# Altium footprint library Package_BGA.PcbLib: 159 footprints (part 6 of 22) (continued)
## Linear_BGA-133_15.0x15.0mm_Layout12x12_P1.27mm [mm] (continued)
F.SilkS:
  lines w0.12: -7.61,6.61 -7.61,-7.61 7.61,-7.61 7.61,7.61 -6.61,7.61
F.CrtYd:
  lines w0.05: -8.5,-8.5 8.5,-8.5 8.5,8.5 -8.5,8.5 -8.5,-8.5
F.Fab:
  lines w0.1: -7.5,-7.5 -7.5,6.5 -6.5,7.5 7.5,7.5 7.5,-7.5 -7.5,-7.5
  text "'.Designator'" at -4.047,-0.84 h1

## MAPBGA_9x9mm_Layout17x17_P0.5mm [mm]
pads (272):
  round 0.25 smd: A2(-3.5,4) A3(-3,4) A4(-2.5,4) A5(-2,4) A6(-1.5,4) A7(-1,4) A8(-0.5,4) A9(0,4) A10(0.5,4) A11(1,4) A12(1.5,4) A13(2,4) A14(2.5,4) A15(3,4) A16(3.5,4) A17(4,4) B1(-4,3.5) B2(-3.5,3.5) B3(-3,3.5) B4(-2.5,3.5) B5(-2,3.5) B6(-1.5,3.5) B7(-1,3.5) B8(-0.5,3.5) B9(0,3.5) B10(0.5,3.5) B11(1,3.5) B12(1.5,3.5) B13(2,3.5) B14(2.5,3.5) B15(3,3.5) B16(3.5,3.5) B17(4,3.5) C1(-4,3) C2(-3.5,3) C3(-3,3) C4(-2.5,3) C5(-2,3) C6(-1.5,3) C7(-1,3) C8(-0.5,3) C9(0,3) C10(0.5,3) C11(1,3) C12(1.5,3) C13(2,3) C14(2.5,3) C15(3,3) C16(3.5,3) C17(4,3) D1(-4,2.5) D2(-3.5,2.5) D3(-3,2.5) D4(-2.5,2.5) D5(-2,2.5) D6(-1.5,2.5) D7(-1,2.5) D8(-0.5,2.5) D9(0,2.5) D10(0.5,2.5) D11(1,2.5) D12(1.5,2.5) D13(2,2.5) D14(2.5,2.5) D15(3,2.5) D16(3.5,2.5) D17(4,2.5) E1(-4,2) E2(-3.5,2) E3(-3,2) E4(-2.5,2) E5(-2,2) E6(-1.5,2) E7(-1,2) E8(-0.5,2) E9(0,2) E10(0.5,2) E11(1,2) E12(1.5,2) E13(2,2) E14(2.5,2) E15(3,2) E16(3.5,2) E17(4,2) F1(-4,1.5) F2(-3.5,1.5) F3(-3,1.5) F4(-2.5,1.5) F5(-2,1.5) F8(-0.5,1.5) F10(0.5,1.5) F13(2,1.5) F14(2.5,1.5) F15(3,1.5) F16(3.5,1.5) F17(4,1.5) G1(-4,1) G2(-3.5,1) G3(-3,1) G4(-2.5,1) G5(-2,1) G7(-1,1) G8(-0.5,1) G9(0,1) G10(0.5,1) G11(1,1) G13(2,1) G14(2.5,1) G15(3,1) G16(3.5,1) G17(4,1) H1(-4,0.5) H2(-3.5,0.5) H3(-3,0.5) H4(-2.5,0.5) H5(-2,0.5) H6(-1.5,0.5) H7(-1,0.5) H8(-0.5,0.5) H9(0,0.5) H10(0.5,0.5) H11(1,0.5) H12(1.5,0.5) H13(2,0.5) H14(2.5,0.5) H15(3,0.5) H16(3.5,0.5) H17(4,0.5) J1(-4,0) J2(-3.5,0) J3(-3,0) J4(-2.5,0) J5(-2,0) J7(-1,0) J8(-0.5,0) J9(0,0) J10(0.5,0) J11(1,0) J13(2,0) J14(2.5,0) J15(3,0) J16(3.5,0) J17(4,0) K1(-4,-0.5) K2(-3.5,-0.5) K3(-3,-0.5) K4(-2.5,-0.5) K5(-2,-0.5) K6(-1.5,-0.5) K7(-1,-0.5) K8(-0.5,-0.5) K9(0,-0.5) K10(0.5,-0.5) K11(1,-0.5) K12(1.5,-0.5) K13(2,-0.5) K14(2.5,-0.5) K15(3,-0.5) K16(3.5,-0.5) K17(4,-0.5) L1(-4,-1) L2(-3.5,-1) L3(-3,-1) L4(-2.5,-1) L5(-2,-1) L7(-1,-1) L8(-0.5,-1) L9(0,-1) L10(0.5,-1) L11(1,-1) L13(2,-1) L14(2.5,-1) L15(3,-1) L16(3.5,-1) L17(4,-1) M1(-4,-1.5) M2(-3.5,-1.5) M3(-3,-1.5) M4(-2.5,-1.5) M5(-2,-1.5) M8(-0.5,-1.5) M10(0.5,-1.5) M13(2,-1.5) M14(2.5,-1.5) M15(3,-1.5) M16(3.5,-1.5) M17(4,-1.5) N1(-4,-2) N2(-3.5,-2) N3(-3,-2) N4(-2.5,-2) N5(-2,-2) N6(-1.5,-2) N7(-1,-2) N8(-0.5,-2) N9(0,-2) N10(0.5,-2) N11(1,-2) N12(1.5,-2) N13(2,-2) N14(2.5,-2) N15(3,-2) N16(3.5,-2) N17(4,-2) P1(-4,-2.5) P2(-3.5,-2.5) P3(-3,-2.5) P4(-2.5,-2.5) P5(-2,-2.5) P6(-1.5,-2.5) P7(-1,-2.5) P8(-0.5,-2.5) P9(0,-2.5) P10(0.5,-2.5) P11(1,-2.5) P12(1.5,-2.5) P13(2,-2.5) P14(2.5,-2.5) P15(3,-2.5) P16(3.5,-2.5) P17(4,-2.5) R1(-4,-3) R2(-3.5,-3) R3(-3,-3) R4(-2.5,-3) R5(-2,-3) R6(-1.5,-3) R7(-1,-3) R8(-0.5,-3) R9(0,-3) R10(0.5,-3) R11(1,-3) R12(1.5,-3) R13(2,-3) R14(2.5,-3) R15(3,-3) R16(3.5,-3) R17(4,-3) T1(-4,-3.5) T2(-3.5,-3.5) T3(-3,-3.5) T4(-2.5,-3.5) T5(-2,-3.5) T6(-1.5,-3.5) T7(-1,-3.5) T8(-0.5,-3.5) T9(0,-3.5) T10(0.5,-3.5) T11(1,-3.5) T12(1.5,-3.5) T13(2,-3.5) T14(2.5,-3.5) T15(3,-3.5) T16(3.5,-3.5) T17(4,-3.5) U1(-4,-4) U2(-3.5,-4) U3(-3,-4) U4(-2.5,-4) U5(-2,-4) U6(-1.5,-4) U7(-1,-4) U8(-0.5,-4) U9(0,-4) U10(0.5,-4) U11(1,-4) U12(1.5,-4) U13(2,-4) U14(2.5,-4) U15(3,-4) U16(3.5,-4) U17(4,-4)
F.SilkS:
  lines w0.12: -4.61,3.61 -4.61,-4.61 4.61,-4.61 4.61,4.61 -3.61,4.61
F.CrtYd:
  lines w0.05: -5.5,-5.5 -5.5,5.5 5.5,5.5 5.5,-5.5 -5.5,-5.5
F.Fab:
  lines w0.1: -4.5,-4.5 4.5,-4.5 4.5,4.5 -3.5,4.5 -4.5,3.5 -4.5,-4.5
  text "'.Designator'" at -4.047,-0.84 h1

## MAPBGA_14x14mm_Layout17x17_P0.8mm [mm]
pads (289):
  round 0.35 smd: A1(-6.4,6.4) A2(-5.6,6.4) A3(-4.8,6.4) A4(-4,6.4) A5(-3.2,6.4) A6(-2.4,6.4) A7(-1.6,6.4) A8(-0.8,6.4) A9(0,6.4) A10(0.8,6.4) A11(1.6,6.4) A12(2.4,6.4) A13(3.2,6.4) A14(4,6.4) A15(4.8,6.4) A16(5.6,6.4) A17(6.4,6.4) B1(-6.4,5.6) B2(-5.6,5.6) B3(-4.8,5.6) B4(-4,5.6) B5(-3.2,5.6) B6(-2.4,5.6) B7(-1.6,5.6) B8(-0.8,5.6) B9(0,5.6) B10(0.8,5.6) B11(1.6,5.6) B12(2.4,5.6) B13(3.2,5.6) B14(4,5.6) B15(4.8,5.6) B16(5.6,5.6) B17(6.4,5.6) C1(-6.4,4.8) C2(-5.6,4.8) C3(-4.8,4.8) C4(-4,4.8) C5(-3.2,4.8) C6(-2.4,4.8) C7(-1.6,4.8) C8(-0.8,4.8) C9(0,4.8) C10(0.8,4.8) C11(1.6,4.8) C12(2.4,4.8) C13(3.2,4.8) C14(4,4.8) C15(4.8,4.8) C16(5.6,4.8) C17(6.4,4.8) D1(-6.4,4) D2(-5.6,4) D3(-4.8,4) D4(-4,4) D5(-3.2,4) D6(-2.4,4) D7(-1.6,4) D8(-0.8,4) D9(0,4) D10(0.8,4) D11(1.6,4) D12(2.4,4) D13(3.2,4) D14(4,4) D15(4.8,4) D16(5.6,4) D17(6.4,4) E1(-6.4,3.2) E2(-5.6,3.2) E3(-4.8,3.2) E4(-4,3.2) E5(-3.2,3.2) E6(-2.4,3.2) E7(-1.6,3.2) E8(-0.8,3.2) E9(0,3.2) E10(0.8,3.2) E11(1.6,3.2) E12(2.4,3.2) E13(3.2,3.2) E14(4,3.2) E15(4.8,3.2) E16(5.6,3.2) E17(6.4,3.2) F1(-6.4,2.4) F2(-5.6,2.4) F3(-4.8,2.4) F4(-4,2.4) F5(-3.2,2.4) F6(-2.4,2.4) F7(-1.6,2.4) F8(-0.8,2.4) F9(0,2.4) F10(0.8,2.4) F11(1.6,2.4) F12(2.4,2.4) F13(3.2,2.4) F14(4,2.4) F15(4.8,2.4) F16(5.6,2.4) F17(6.4,2.4) G1(-6.4,1.6) G2(-5.6,1.6) G3(-4.8,1.6) G4(-4,1.6) G5(-3.2,1.6) G6(-2.4,1.6) G7(-1.6,1.6) G8(-0.8,1.6) G9(0,1.6) G10(0.8,1.6) G11(1.6,1.6) G12(2.4,1.6) G13(3.2,1.6) G14(4,1.6) G15(4.8,1.6) G16(5.6,1.6) G17(6.4,1.6) H1(-6.4,0.8) H2(-5.6,0.8) H3(-4.8,0.8) H4(-4,0.8) H5(-3.2,0.8) H6(-2.4,0.8) H7(-1.6,0.8) H8(-0.8,0.8) H9(0,0.8) H10(0.8,0.8) H11(1.6,0.8) H12(2.4,0.8) H13(3.2,0.8) H14(4,0.8) H15(4.8,0.8) H16(5.6,0.8) H17(6.4,0.8) J1(-6.4,0) J2(-5.6,0) J3(-4.8,0) J4(-4,0) J5(-3.2,0) J6(-2.4,0) J7(-1.6,0) J8(-0.8,0) J9(0,0) J10(0.8,0) J11(1.6,0) J12(2.4,0) J13(3.2,0) J14(4,0) J15(4.8,0) J16(5.6,0) J17(6.4,0) K1(-6.4,-0.8) K2(-5.6,-0.8) K3(-4.8,-0.8) K4(-4,-0.8) K5(-3.2,-0.8) K6(-2.4,-0.8) K7(-1.6,-0.8) K8(-0.8,-0.8) K9(0,-0.8) K10(0.8,-0.8) K11(1.6,-0.8) K12(2.4,-0.8) K13(3.2,-0.8) K14(4,-0.8) K15(4.8,-0.8) K16(5.6,-0.8) K17(6.4,-0.8) L1(-6.4,-1.6) L2(-5.6,-1.6) L3(-4.8,-1.6) L4(-4,-1.6) L5(-3.2,-1.6) L6(-2.4,-1.6) L7(-1.6,-1.6) L8(-0.8,-1.6) L9(0,-1.6) L10(0.8,-1.6) L11(1.6,-1.6) L12(2.4,-1.6) L13(3.2,-1.6) L14(4,-1.6) L15(4.8,-1.6) L16(5.6,-1.6) L17(6.4,-1.6) M1(-6.4,-2.4) M2(-5.6,-2.4) M3(-4.8,-2.4) M4(-4,-2.4) M5(-3.2,-2.4) M6(-2.4,-2.4) M7(-1.6,-2.4) M8(-0.8,-2.4) M9(0,-2.4) M10(0.8,-2.4) M11(1.6,-2.4) M12(2.4,-2.4) M13(3.2,-2.4) M14(4,-2.4) M15(4.8,-2.4) M16(5.6,-2.4) M17(6.4,-2.4) N1(-6.4,-3.2) N2(-5.6,-3.2) N3(-4.8,-3.2) N4(-4,-3.2) N5(-3.2,-3.2) N6(-2.4,-3.2) N7(-1.6,-3.2) N8(-0.8,-3.2) N9(0,-3.2) N10(0.8,-3.2) N11(1.6,-3.2) N12(2.4,-3.2) N13(3.2,-3.2) N14(4,-3.2) N15(4.8,-3.2) N16(5.6,-3.2) N17(6.4,-3.2) P1(-6.4,-4) P2(-5.6,-4) P3(-4.8,-4) P4(-4,-4) P5(-3.2,-4) P6(-2.4,-4) P7(-1.6,-4) P8(-0.8,-4) P9(0,-4) P10(0.8,-4) P11(1.6,-4) P12(2.4,-4) P13(3.2,-4) P14(4,-4) P15(4.8,-4) P16(5.6,-4) P17(6.4,-4) R1(-6.4,-4.8) R2(-5.6,-4.8) R3(-4.8,-4.8) R4(-4,-4.8) R5(-3.2,-4.8) R6(-2.4,-4.8) R7(-1.6,-4.8) R8(-0.8,-4.8) R9(0,-4.8) R10(0.8,-4.8) R11(1.6,-4.8) R12(2.4,-4.8) R13(3.2,-4.8) R14(4,-4.8) R15(4.8,-4.8) R16(5.6,-4.8) R17(6.4,-4.8) T1(-6.4,-5.6) T2(-5.6,-5.6) T3(-4.8,-5.6) T4(-4,-5.6) T5(-3.2,-5.6) T6(-2.4,-5.6) T7(-1.6,-5.6) T8(-0.8,-5.6) T9(0,-5.6) T10(0.8,-5.6) T11(1.6,-5.6) T12(2.4,-5.6) T13(3.2,-5.6) T14(4,-5.6) T15(4.8,-5.6) T16(5.6,-5.6) T17(6.4,-5.6) U1(-6.4,-6.4) U2(-5.6,-6.4) U3(-4.8,-6.4) U4(-4,-6.4) U5(-3.2,-6.4) U6(-2.4,-6.4) U7(-1.6,-6.4) U8(-0.8,-6.4) U9(0,-6.4) U10(0.8,-6.4) U11(1.6,-6.4) U12(2.4,-6.4) U13(3.2,-6.4) U14(4,-6.4) U15(4.8,-6.4) U16(5.6,-6.4) U17(6.4,-6.4)
F.SilkS:
  lines w0.12: -7.11,6.11 -7.11,-7.11 7.11,-7.11 7.11,7.11 -6.11,7.11
F.CrtYd:
  lines w0.05: -8,-8 -8,8 8,8 8,-8 -8,-8
F.Fab:
  lines w0.1: -7,-7 7,-7 7,7 -6,7 -7,6 -7,-7
  text "'.Designator'" at -4.047,-0.84 h1

## Maxim_WLP-9_1.595x1.415_Layout3x3_P0.4mm_Ball0.27mm_Pad0.25mm_NSMD [mm]
pads (9):
  round 0.25 smd: A1(-0.4,0.4) A2(0,0.4) A3(0.4,0.4) B1(-0.4,0) B2(0,0) B3(0.4,0) C1(-0.4,-0.4) C2(0,-0.4) C3(0.4,-0.4)
F.SilkS:
  lines w0.1: -1.15,0.55 -1.15,1.05 -0.65,1.05 ; -0.95,-0.85 0.95,-0.85 0.95,0.85 -0.95,0.85 -0.95,-0.85
F.CrtYd:
  lines w0.05: -1.8,-1.7 1.8,-1.7 1.8,1.7 -1.8,1.7 -1.8,-1.7
F.Fab:
  lines w0.1: -0.797,-0.707 -0.797,0.308 -0.397,0.707 0.797,0.707 0.797,-0.707 -0.797,-0.707
  text "'.Designator'" at -2.023,-1.72 h0.5

## Maxim_WLP-12 [mm]
pads (12):
  round 0.3 smd: A1(-0.75,0.5) A2(-0.25,0.5) A3(0.25,0.5) A4(0.75,0.5) B1(-0.75,0) B2(-0.25,0) B3(0.25,0) B4(0.75,0) C1(-0.75,-0.5) C2(-0.25,-0.5) C3(0.25,-0.5) C4(0.75,-0.5)
F.SilkS:
  lines w0.1: -1.3,0.1 -1.3,1.1 -0.3,1.1 ; -1.1,-0.9 1.1,-0.9 1.1,0.9 -1.1,0.9 -1.1,-0.9
F.CrtYd:
  lines w0.05: -2.02,-1.78 -2.02,1.78 2.02,1.78 2.02,-1.78 -2.02,-1.78
F.Fab:
  lines w0.1: -1.02,-0.78 -1.02,0.54 -0.75,0.78 1.02,0.78 1.02,-0.78 -1.02,-0.78
  text "'.Designator'" at -1.599,-0.316 h0.4

## Microchip_TFBGA-196_11x11mm_Layout14x14_P0.75mm_SMD [mm]
pads (196):
  round 0.35 smd: A1(-4.875,4.875) A2(-4.125,4.875) A3(-3.375,4.875) A4(-2.625,4.875) A5(-1.875,4.875) A6(-1.125,4.875) A7(-0.375,4.875) A8(0.375,4.875) A9(1.125,4.875) A10(1.875,4.875) A11(2.625,4.875) A12(3.375,4.875) A13(4.125,4.875) A14(4.875,4.875) B1(-4.875,4.125) B2(-4.125,4.125) B3(-3.375,4.125) B4(-2.625,4.125) B5(-1.875,4.125) B6(-1.125,4.125) B7(-0.375,4.125) B8(0.375,4.125) B9(1.125,4.125) B10(1.875,4.125) B11(2.625,4.125) B12(3.375,4.125) B13(4.125,4.125) B14(4.875,4.125) C1(-4.875,3.375) C2(-4.125,3.375) C3(-3.375,3.375) C4(-2.625,3.375) C5(-1.875,3.375) C6(-1.125,3.375) C7(-0.375,3.375) C8(0.375,3.375) C9(1.125,3.375) C10(1.875,3.375) C11(2.625,3.375) C12(3.375,3.375) C13(4.125,3.375) C14(4.875,3.375) D1(-4.875,2.625) D2(-4.125,2.625) D3(-3.375,2.625) D4(-2.625,2.625) D5(-1.875,2.625) D6(-1.125,2.625) D7(-0.375,2.625) D8(0.375,2.625) D9(1.125,2.625) D10(1.875,2.625) D11(2.625,2.625) D12(3.375,2.625) D13(4.125,2.625) D14(4.875,2.625) E1(-4.875,1.875) E2(-4.125,1.875) E3(-3.375,1.875) E4(-2.625,1.875) E5(-1.875,1.875) E6(-1.125,1.875) E7(-0.375,1.875) E8(0.375,1.875) E9(1.125,1.875) E10(1.875,1.875) E11(2.625,1.875) E12(3.375,1.875) E13(4.125,1.875) E14(4.875,1.875) F1(-4.875,1.125) F2(-4.125,1.125) F3(-3.375,1.125) F4(-2.625,1.125) F5(-1.875,1.125) F6(-1.125,1.125) F7(-0.375,1.125) F8(0.375,1.125) F9(1.125,1.125) F10(1.875,1.125) F11(2.625,1.125) F12(3.375,1.125) F13(4.125,1.125) F14(4.875,1.125) G1(-4.875,0.375) G2(-4.125,0.375) G3(-3.375,0.375) G4(-2.625,0.375) G5(-1.875,0.375) G6(-1.125,0.375) G7(-0.375,0.375) G8(0.375,0.375) G9(1.125,0.375) G10(1.875,0.375) G11(2.625,0.375) G12(3.375,0.375) G13(4.125,0.375) G14(4.875,0.375) H1(-4.875,-0.375) H2(-4.125,-0.375) H3(-3.375,-0.375) H4(-2.625,-0.375) H5(-1.875,-0.375) H6(-1.125,-0.375) H7(-0.375,-0.375) H8(0.375,-0.375) H9(1.125,-0.375) H10(1.875,-0.375) H11(2.625,-0.375) H12(3.375,-0.375) H13(4.125,-0.375) H14(4.875,-0.375) J1(-4.875,-1.125) J2(-4.125,-1.125) J3(-3.375,-1.125) J4(-2.625,-1.125) J5(-1.875,-1.125) J6(-1.125,-1.125) J7(-0.375,-1.125) J8(0.375,-1.125) J9(1.125,-1.125) J10(1.875,-1.125) J11(2.625,-1.125) J12(3.375,-1.125) J13(4.125,-1.125) J14(4.875,-1.125) K1(-4.875,-1.875) K2(-4.125,-1.875) K3(-3.375,-1.875) K4(-2.625,-1.875) K5(-1.875,-1.875) K6(-1.125,-1.875) K7(-0.375,-1.875) K8(0.375,-1.875) K9(1.125,-1.875) K10(1.875,-1.875) K11(2.625,-1.875) K12(3.375,-1.875) K13(4.125,-1.875) K14(4.875,-1.875) L1(-4.875,-2.625) L2(-4.125,-2.625) L3(-3.375,-2.625) L4(-2.625,-2.625) L5(-1.875,-2.625) L6(-1.125,-2.625) L7(-0.375,-2.625) L8(0.375,-2.625) L9(1.125,-2.625) L10(1.875,-2.625) L11(2.625,-2.625) L12(3.375,-2.625) L13(4.125,-2.625) L14(4.875,-2.625) M1(-4.875,-3.375) M2(-4.125,-3.375) M3(-3.375,-3.375) M4(-2.625,-3.375) M5(-1.875,-3.375) M6(-1.125,-3.375) M7(-0.375,-3.375) M8(0.375,-3.375) M9(1.125,-3.375) M10(1.875,-3.375) M11(2.625,-3.375) M12(3.375,-3.375) M13(4.125,-3.375) M14(4.875,-3.375) N1(-4.875,-4.125) N2(-4.125,-4.125) N3(-3.375,-4.125) N4(-2.625,-4.125) N5(-1.875,-4.125) N6(-1.125,-4.125) N7(-0.375,-4.125) N8(0.375,-4.125) N9(1.125,-4.125) N10(1.875,-4.125) N11(2.625,-4.125) N12(3.375,-4.125) N13(4.125,-4.125) N14(4.875,-4.125) P1(-4.875,-4.875) P2(-4.125,-4.875) P3(-3.375,-4.875) P4(-2.625,-4.875) P5(-1.875,-4.875) P6(-1.125,-4.875) P7(-0.375,-4.875) P8(0.375,-4.875) P9(1.125,-4.875) P10(1.875,-4.875) P11(2.625,-4.875) P12(3.375,-4.875) P13(4.125,-4.875) P14(4.875,-4.875)
F.SilkS:
  lines w0.12: -5.61,4.61 -5.61,-5.61 5.61,-5.61 5.61,5.61 -4.61,5.61
F.CrtYd:
  lines w0.05: -6.5,-6.5 -6.5,6.5 6.5,6.5 6.5,-6.5 -6.5,-6.5
F.Fab:
  lines w0.1: -5.5,-5.5 5.5,-5.5 5.5,5.5 -4.5,5.5 -5.5,4.5 -5.5,-5.5
  text "'.Designator'" at -4.047,-0.84 h1

## Micron_FBGA-78_7.5x10.6mm_Layout9x13_P0.8mm [mm]
pads (78):
  round 0.4 smd: A1(-3.2,4.8) A2(-2.4,4.8) A3(-1.6,4.8) A7(1.6,4.8) A8(2.4,4.8) A9(3.2,4.8) B1(-3.2,4) B2(-2.4,4) B3(-1.6,4) B7(1.6,4) B8(2.4,4) B9(3.2,4) C1(-3.2,3.2) C2(-2.4,3.2) C3(-1.6,3.2) C7(1.6,3.2) C8(2.4,3.2) C9(3.2,3.2) D1(-3.2,2.4) D2(-2.4,2.4) D3(-1.6,2.4) D7(1.6,2.4) D8(2.4,2.4) D9(3.2,2.4) E1(-3.2,1.6) E2(-2.4,1.6) E3(-1.6,1.6) E7(1.6,1.6) E8(2.4,1.6) E9(3.2,1.6) F1(-3.2,0.8) F2(-2.4,0.8) F3(-1.6,0.8) F7(1.6,0.8) F8(2.4,0.8) F9(3.2,0.8) G1(-3.2,0) G2(-2.4,0) G3(-1.6,0) G7(1.6,0) G8(2.4,0) G9(3.2,0) H1(-3.2,-0.8) H2(-2.4,-0.8) H3(-1.6,-0.8) H7(1.6,-0.8) H8(2.4,-0.8) H9(3.2,-0.8) J1(-3.2,-1.6) J2(-2.4,-1.6) J3(-1.6,-1.6) J7(1.6,-1.6) J8(2.4,-1.6) J9(3.2,-1.6) K1(-3.2,-2.4) K2(-2.4,-2.4) K3(-1.6,-2.4) K7(1.6,-2.4) K8(2.4,-2.4) K9(3.2,-2.4) L1(-3.2,-3.2) L2(-2.4,-3.2) L3(-1.6,-3.2) L7(1.6,-3.2) L8(2.4,-3.2) L9(3.2,-3.2) M1(-3.2,-4) M2(-2.4,-4) M3(-1.6,-4) M7(1.6,-4) M8(2.4,-4) M9(3.2,-4) N1(-3.2,-4.8) N2(-2.4,-4.8) N3(-1.6,-4.8) N7(1.6,-4.8) N8(2.4,-4.8) N9(3.2,-4.8)
F.SilkS:
  lines w0.12: -3.86,4.41 -3.86,-5.41 3.86,-5.41 3.86,5.41 -2.86,5.41
F.CrtYd:
  lines w0.05: -4.75,-6.3 -4.75,6.3 4.75,6.3 4.75,-6.3 -4.75,-6.3
F.Fab:
  lines w0.1: -3.75,-5.3 3.75,-5.3 3.75,5.3 -2.75,5.3 -3.75,4.3 -3.75,-5.3
  text "'.Designator'" at -4.047,-0.84 h1

## Micron_FBGA-78_8x10.5mm_Layout9x13_P0.8mm [mm]
pads (78):
  round 0.4 smd: A1(-3.2,4.8) A2(-2.4,4.8) A3(-1.6,4.8) A7(1.6,4.8) A8(2.4,4.8) A9(3.2,4.8) B1(-3.2,4) B2(-2.4,4) B3(-1.6,4) B7(1.6,4) B8(2.4,4) B9(3.2,4) C1(-3.2,3.2) C2(-2.4,3.2) C3(-1.6,3.2) C7(1.6,3.2) C8(2.4,3.2) C9(3.2,3.2) D1(-3.2,2.4) D2(-2.4,2.4) D3(-1.6,2.4) D7(1.6,2.4) D8(2.4,2.4) D9(3.2,2.4) E1(-3.2,1.6) E2(-2.4,1.6) E3(-1.6,1.6) E7(1.6,1.6) E8(2.4,1.6) E9(3.2,1.6) F1(-3.2,0.8) F2(-2.4,0.8) F3(-1.6,0.8) F7(1.6,0.8) F8(2.4,0.8) F9(3.2,0.8) G1(-3.2,0) G2(-2.4,0) G3(-1.6,0) G7(1.6,0) G8(2.4,0) G9(3.2,0) H1(-3.2,-0.8) H2(-2.4,-0.8) H3(-1.6,-0.8) H7(1.6,-0.8) H8(2.4,-0.8) H9(3.2,-0.8) J1(-3.2,-1.6) J2(-2.4,-1.6) J3(-1.6,-1.6) J7(1.6,-1.6) J8(2.4,-1.6) J9(3.2,-1.6) K1(-3.2,-2.4) K2(-2.4,-2.4) K3(-1.6,-2.4) K7(1.6,-2.4) K8(2.4,-2.4) K9(3.2,-2.4) L1(-3.2,-3.2) L2(-2.4,-3.2) L3(-1.6,-3.2) L7(1.6,-3.2) L8(2.4,-3.2) L9(3.2,-3.2) M1(-3.2,-4) M2(-2.4,-4) M3(-1.6,-4) M7(1.6,-4) M8(2.4,-4) M9(3.2,-4) N1(-3.2,-4.8) N2(-2.4,-4.8) N3(-1.6,-4.8) N7(1.6,-4.8) N8(2.4,-4.8) N9(3.2,-4.8)
F.SilkS:
  lines w0.12: -4.11,4.36 -4.11,-5.36 4.11,-5.36 4.11,5.36 -3.11,5.36
F.CrtYd:
  lines w0.05: -5,-6.25 -5,6.25 5,6.25 5,-6.25 -5,-6.25
F.Fab:
  lines w0.1: -4,-5.25 4,-5.25 4,5.25 -3,5.25 -4,4.25 -4,-5.25
  text "'.Designator'" at -4.047,-0.84 h1

## Micron_FBGA-78_9x10.5mm_Layout9x13_P0.8mm [mm]
pads (78):
  round 0.45 smd: A1(-3.2,4.8) A2(-2.4,4.8) A3(-1.6,4.8) A7(1.6,4.8) A8(2.4,4.8) A9(3.2,4.8) B1(-3.2,4) B2(-2.4,4) B3(-1.6,4) B7(1.6,4) B8(2.4,4) B9(3.2,4) C1(-3.2,3.2) C2(-2.4,3.2) C3(-1.6,3.2) C7(1.6,3.2) C8(2.4,3.2) C9(3.2,3.2) D1(-3.2,2.4) D2(-2.4,2.4) D3(-1.6,2.4) D7(1.6,2.4) D8(2.4,2.4) D9(3.2,2.4) E1(-3.2,1.6) E2(-2.4,1.6) E3(-1.6,1.6) E7(1.6,1.6) E8(2.4,1.6) E9(3.2,1.6) F1(-3.2,0.8) F2(-2.4,0.8) F3(-1.6,0.8) F7(1.6,0.8) F8(2.4,0.8) F9(3.2,0.8) G1(-3.2,0) G2(-2.4,0) G3(-1.6,0) G7(1.6,0) G8(2.4,0) G9(3.2,0) H1(-3.2,-0.8) H2(-2.4,-0.8) H3(-1.6,-0.8) H7(1.6,-0.8) H8(2.4,-0.8) H9(3.2,-0.8) J1(-3.2,-1.6) J2(-2.4,-1.6) J3(-1.6,-1.6) J7(1.6,-1.6) J8(2.4,-1.6) J9(3.2,-1.6) K1(-3.2,-2.4) K2(-2.4,-2.4) K3(-1.6,-2.4) K7(1.6,-2.4) K8(2.4,-2.4) K9(3.2,-2.4) L1(-3.2,-3.2) L2(-2.4,-3.2) L3(-1.6,-3.2) L7(1.6,-3.2) L8(2.4,-3.2) L9(3.2,-3.2) M1(-3.2,-4) M2(-2.4,-4) M3(-1.6,-4) M7(1.6,-4) M8(2.4,-4) M9(3.2,-4) N1(-3.2,-4.8) N2(-2.4,-4.8) N3(-1.6,-4.8) N7(1.6,-4.8) N8(2.4,-4.8) N9(3.2,-4.8)
F.SilkS:
  lines w0.12: -4.61,4.36 -4.61,-5.36 4.61,-5.36 4.61,5.36 -3.61,5.36
F.CrtYd:
  lines w0.05: -5.5,-6.25 -5.5,6.25 5.5,6.25 5.5,-6.25 -5.5,-6.25
F.Fab:
  lines w0.1: -4.5,-5.25 4.5,-5.25 4.5,5.25 -3.5,5.25 -4.5,4.25 -4.5,-5.25
  text "'.Designator'" at -4.047,-0.84 h1

## Micron_FBGA-96_7.5x13.5mm_Layout9x16_P0.8mm [mm]
pads (96):
  round 0.4 smd: A1(-3.2,6) A2(-2.4,6) A3(-1.6,6) A7(1.6,6) A8(2.4,6) A9(3.2,6) B1(-3.2,5.2) B2(-2.4,5.2) B3(-1.6,5.2) B7(1.6,5.2) B8(2.4,5.2) B9(3.2,5.2) C1(-3.2,4.4) C2(-2.4,4.4) C3(-1.6,4.4) C7(1.6,4.4) C8(2.4,4.4) C9(3.2,4.4) D1(-3.2,3.6) D2(-2.4,3.6) D3(-1.6,3.6) D7(1.6,3.6) D8(2.4,3.6) D9(3.2,3.6) E1(-3.2,2.8) E2(-2.4,2.8) E3(-1.6,2.8) E7(1.6,2.8) E8(2.4,2.8) E9(3.2,2.8) F1(-3.2,2) F2(-2.4,2) F3(-1.6,2) F7(1.6,2) F8(2.4,2) F9(3.2,2) G1(-3.2,1.2) G2(-2.4,1.2) G3(-1.6,1.2) G7(1.6,1.2) G8(2.4,1.2) G9(3.2,1.2) H1(-3.2,0.4) H2(-2.4,0.4) H3(-1.6,0.4) H7(1.6,0.4) H8(2.4,0.4) H9(3.2,0.4) J1(-3.2,-0.4) J2(-2.4,-0.4) J3(-1.6,-0.4) J7(1.6,-0.4) J8(2.4,-0.4) J9(3.2,-0.4) K1(-3.2,-1.2) K2(-2.4,-1.2) K3(-1.6,-1.2) K7(1.6,-1.2) K8(2.4,-1.2) K9(3.2,-1.2) L1(-3.2,-2) L2(-2.4,-2) L3(-1.6,-2) L7(1.6,-2) L8(2.4,-2) L9(3.2,-2) M1(-3.2,-2.8) M2(-2.4,-2.8) M3(-1.6,-2.8) M7(1.6,-2.8) M8(2.4,-2.8) M9(3.2,-2.8) N1(-3.2,-3.6) N2(-2.4,-3.6) N3(-1.6,-3.6) N7(1.6,-3.6) N8(2.4,-3.6) N9(3.2,-3.6) P1(-3.2,-4.4) P2(-2.4,-4.4) P3(-1.6,-4.4) P7(1.6,-4.4) P8(2.4,-4.4) P9(3.2,-4.4) R1(-3.2,-5.2) R2(-2.4,-5.2) R3(-1.6,-5.2) R7(1.6,-5.2) R8(2.4,-5.2) R9(3.2,-5.2) T1(-3.2,-6) T2(-2.4,-6) T3(-1.6,-6) T7(1.6,-6) T8(2.4,-6) T9(3.2,-6)
F.SilkS:
  lines w0.12: -3.86,5.86 -3.86,-6.86 3.86,-6.86 3.86,6.86 -2.86,6.86
F.CrtYd:
  lines w0.05: -4.75,-7.75 -4.75,7.75 4.75,7.75 4.75,-7.75 -4.75,-7.75
F.Fab:
  lines w0.1: -3.75,-6.75 3.75,-6.75 3.75,6.75 -2.75,6.75 -3.75,5.75 -3.75,-6.75
  text "'.Designator'" at -4.047,-0.84 h1

## Micron_FBGA-96_8x14mm_Layout9x16_P0.8mm [mm]
pads (96):
  round 0.4 smd: A1(-3.2,6) A2(-2.4,6) A3(-1.6,6) A7(1.6,6) A8(2.4,6) A9(3.2,6) B1(-3.2,5.2) B2(-2.4,5.2) B3(-1.6,5.2) B7(1.6,5.2) B8(2.4,5.2) B9(3.2,5.2) C1(-3.2,4.4) C2(-2.4,4.4) C3(-1.6,4.4) C7(1.6,4.4) C8(2.4,4.4) C9(3.2,4.4) D1(-3.2,3.6) D2(-2.4,3.6) D3(-1.6,3.6) D7(1.6,3.6) D8(2.4,3.6) D9(3.2,3.6) E1(-3.2,2.8) E2(-2.4,2.8) E3(-1.6,2.8) E7(1.6,2.8) E8(2.4,2.8) E9(3.2,2.8) F1(-3.2,2) F2(-2.4,2) F3(-1.6,2) F7(1.6,2) F8(2.4,2) F9(3.2,2) G1(-3.2,1.2) G2(-2.4,1.2) G3(-1.6,1.2) G7(1.6,1.2) G8(2.4,1.2) G9(3.2,1.2) H1(-3.2,0.4) H2(-2.4,0.4) H3(-1.6,0.4) H7(1.6,0.4) H8(2.4,0.4) H9(3.2,0.4) J1(-3.2,-0.4) J2(-2.4,-0.4) J3(-1.6,-0.4) J7(1.6,-0.4) J8(2.4,-0.4) J9(3.2,-0.4) K1(-3.2,-1.2) K2(-2.4,-1.2) K3(-1.6,-1.2) K7(1.6,-1.2) K8(2.4,-1.2) K9(3.2,-1.2) L1(-3.2,-2) L2(-2.4,-2) L3(-1.6,-2) L7(1.6,-2) L8(2.4,-2) L9(3.2,-2) M1(-3.2,-2.8) M2(-2.4,-2.8) M3(-1.6,-2.8) M7(1.6,-2.8) M8(2.4,-2.8) M9(3.2,-2.8) N1(-3.2,-3.6) N2(-2.4,-3.6) N3(-1.6,-3.6) N7(1.6,-3.6) N8(2.4,-3.6) N9(3.2,-3.6) P1(-3.2,-4.4) P2(-2.4,-4.4) P3(-1.6,-4.4) P7(1.6,-4.4) P8(2.4,-4.4) P9(3.2,-4.4) R1(-3.2,-5.2) R2(-2.4,-5.2) R3(-1.6,-5.2) R7(1.6,-5.2) R8(2.4,-5.2) R9(3.2,-5.2) T1(-3.2,-6) T2(-2.4,-6) T3(-1.6,-6) T7(1.6,-6) T8(2.4,-6) T9(3.2,-6)
F.SilkS:
  lines w0.12: -4.11,6.11 -4.11,-7.11 4.11,-7.11 4.11,7.11 -3.11,7.11
F.CrtYd:
  lines w0.05: -5,-8 -5,8 5,8 5,-8 -5,-8
F.Fab:
  lines w0.1: -4,-7 4,-7 4,7 -3,7 -4,6 -4,-7
  text "'.Designator'" at -4.047,-0.84 h1

## Micron_FBGA-96_9x14mm_Layout9x16_P0.8mm [mm]
pads (96):
  round 0.4 smd: A1(-3.2,6) A2(-2.4,6) A3(-1.6,6) A7(1.6,6) A8(2.4,6) A9(3.2,6) B1(-3.2,5.2) B2(-2.4,5.2) B3(-1.6,5.2) B7(1.6,5.2) B8(2.4,5.2) B9(3.2,5.2) C1(-3.2,4.4) C2(-2.4,4.4) C3(-1.6,4.4) C7(1.6,4.4) C8(2.4,4.4) C9(3.2,4.4) D1(-3.2,3.6) D2(-2.4,3.6) D3(-1.6,3.6) D7(1.6,3.6) D8(2.4,3.6) D9(3.2,3.6) E1(-3.2,2.8) E2(-2.4,2.8) E3(-1.6,2.8) E7(1.6,2.8) E8(2.4,2.8) E9(3.2,2.8) F1(-3.2,2) F2(-2.4,2) F3(-1.6,2) F7(1.6,2) F8(2.4,2) F9(3.2,2) G1(-3.2,1.2) G2(-2.4,1.2) G3(-1.6,1.2) G7(1.6,1.2) G8(2.4,1.2) G9(3.2,1.2) H1(-3.2,0.4) H2(-2.4,0.4) H3(-1.6,0.4) H7(1.6,0.4) H8(2.4,0.4) H9(3.2,0.4) J1(-3.2,-0.4) J2(-2.4,-0.4) J3(-1.6,-0.4) J7(1.6,-0.4) J8(2.4,-0.4) J9(3.2,-0.4) K1(-3.2,-1.2) K2(-2.4,-1.2) K3(-1.6,-1.2) K7(1.6,-1.2) K8(2.4,-1.2) K9(3.2,-1.2) L1(-3.2,-2) L2(-2.4,-2) L3(-1.6,-2) L7(1.6,-2) L8(2.4,-2) L9(3.2,-2) M1(-3.2,-2.8) M2(-2.4,-2.8) M3(-1.6,-2.8) M7(1.6,-2.8) M8(2.4,-2.8) M9(3.2,-2.8) N1(-3.2,-3.6) N2(-2.4,-3.6) N3(-1.6,-3.6) N7(1.6,-3.6) N8(2.4,-3.6) N9(3.2,-3.6) P1(-3.2,-4.4) P2(-2.4,-4.4) P3(-1.6,-4.4) P7(1.6,-4.4) P8(2.4,-4.4) P9(3.2,-4.4) R1(-3.2,-5.2) R2(-2.4,-5.2) R3(-1.6,-5.2) R7(1.6,-5.2) R8(2.4,-5.2) R9(3.2,-5.2) T1(-3.2,-6) T2(-2.4,-6) T3(-1.6,-6) T7(1.6,-6) T8(2.4,-6) T9(3.2,-6)
F.SilkS:
  lines w0.12: -4.61,6.11 -4.61,-7.11 4.61,-7.11 4.61,7.11 -3.61,7.11
F.CrtYd:
  lines w0.05: -5.5,-8 -5.5,8 5.5,8 5.5,-8 -5.5,-8
F.Fab:
  lines w0.1: -4.5,-7 4.5,-7 4.5,7 -3.5,7 -4.5,6 -4.5,-7
  text "'.Designator'" at -4.047,-0.84 h1